# Altium footprint library ref-packages.PCBLIB: 1543 footprints (part 37 of 103)
Each footprint in its own frame and in the unit in brackets; x right, y up, seen from the top. Pads: shape width x height; smd on the part's side, far side on the other; paste and mask are expansions set on the pad; w line width, h text height; cw(c..) or ccw(c..) is an arc to the next point about the centre after c.
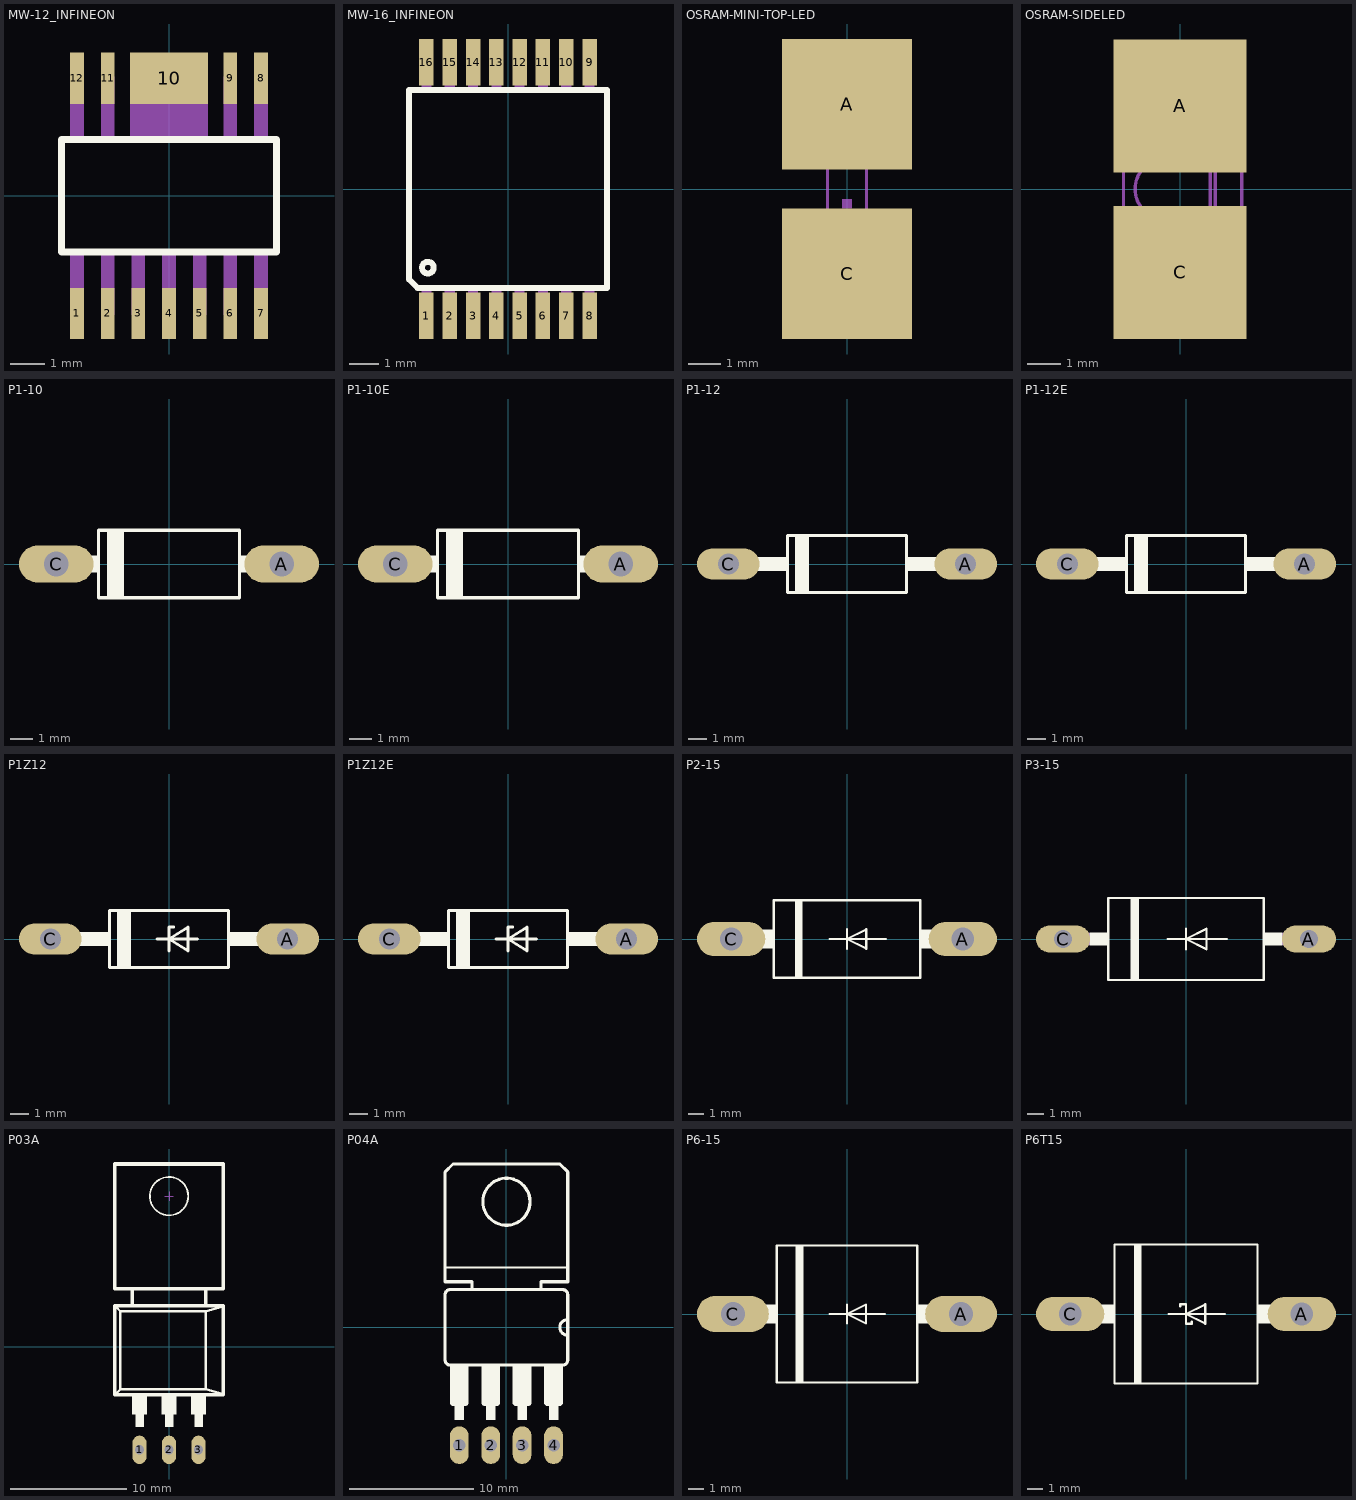
[diagram p36: the footprints below, top view; thin cyan lines are the x and y axes]

## MW-12_INFINEON [mil]
pads (12):
  rect 15.75x59.06 smd: 1(-106.3,-135.83) 2(-70.87,-135.83) 3(-35.43,-135.83) 4(0,-135.83) 5(35.43,-135.83) 6(70.87,-135.83) 7(106.3,-135.83) 8(106.3,135.83) 9(70.87,135.83) 11(-70.87,135.83) 12(-106.3,135.83)
  rect 90.55x59.06 smd: 10(0,135.83)
Top Overlay:
  lines w8: -124.02,-64.96 -124.02,64.96 124.02,64.96 124.02,-64.96 -124.02,-64.96
Mechanical 16:
  rectangle: -114.17,-137.8 -98.43,-66.93
  rectangle: -78.74,-137.8 -62.99,-66.93
  rectangle: -43.31,-137.8 -27.56,-66.93
  rectangle: -7.87,-137.8 7.87,-66.93
  rectangle: 27.56,-137.8 43.31,-66.93
  rectangle: 62.99,-137.8 78.74,-66.93
  rectangle: 98.43,-137.8 114.17,-66.93
  rectangle: 98.43,66.93 114.17,137.8
  rectangle: 62.99,66.93 78.74,137.8
  rectangle: -45.28,66.93 45.28,137.8
  rectangle: -78.74,66.93 -62.99,137.8
  rectangle: -114.17,66.93 -98.43,137.8

## MW-16_INFINEON [mm]
pads (16):
  rect 0.5x1.6 smd: 1(-2.8,-4.35) 2(-2,-4.35) 3(-1.2,-4.35) 4(-0.4,-4.35) 5(0.4,-4.35) 6(1.2,-4.35) 7(2,-4.35) 8(2.8,-4.35) 9(2.8,4.35) 10(2,4.35) 11(1.2,4.35) 12(0.4,4.35) 13(-0.4,4.35) 14(-1.2,4.35) 15(-2,4.35) 16(-2.8,4.35)
Top Overlay:
  circle w0.203: c-2.75,-2.7 r0.2
  lines w0.203: -3.4,-3.1 -3.4,3.4 3.4,3.4 3.4,-3.4 -3.1,-3.4 -3.4,-3.1
Mechanical 16:
  rectangle: -2.175,-4.5 -1.825,-3.475
  rectangle: -1.375,-4.5 -1.025,-3.475
  rectangle: -0.575,-4.5 -0.225,-3.475
  rectangle: 0.225,-4.5 0.575,-3.475
  rectangle: 1.025,-4.5 1.375,-3.475
  rectangle: 1.825,-4.5 2.175,-3.475
  rectangle: 2.625,-4.5 2.975,-3.475
  rectangle: 2.625,3.475 2.975,4.5
  rectangle: 1.825,3.475 2.175,4.5
  rectangle: 1.025,3.475 1.375,4.5
  rectangle: 0.225,3.475 0.575,4.5
  rectangle: -0.575,3.475 -0.225,4.5
  rectangle: -1.375,3.475 -1.025,4.5
  rectangle: -2.175,3.475 -1.825,4.5
  rectangle: -2.975,3.475 -2.625,4.5
  rectangle: -2.975,-4.5 -2.625,-3.475

## OSRAM-MINI-TOP-LED [mm]
pads (2):
  rect 4x4 smd: A(0,2.6) C(0,-2.6)
Top Overlay:
  text "A" at -0.635,1.905 h1.97
  text "C" at -0.635,-3.175 h1.97
Top Paste:
  rectangle: -0.5,0.6 0.5,1.4
  rectangle: -0.5,-1.4 0.5,-0.6
  rectangle: -0.45,0.65 0.45,1.35
  rectangle: -0.45,-1.35 0.45,-0.65
Mechanical 16:
  rectangle: -0.15,-0.6 0.15,-0.3
  lines w0.102: -0.45,0.95 -0.45,1.1 0.45,1.1 0.45,0.95 ; 0.45,-0.95 0.45,-1.1 -0.45,-1.1 -0.45,-0.9 -0.4,-0.9 ; -0.4,-0.9 0.6,-0.9 0.6,0.9 -0.6,0.9 -0.6,-0.7 -0.4,-0.9

## OSRAM-SIDELED [mm]
pads (2):
  rect 4x4 smd: A(0,2.5) C(0,-2.5)
Top Overlay:
  text "C" at 0.635,-3.175 h1.97
  text "A" at 0.635,2.54 h1.97
Top Paste:
  rectangle: -2.15,-2 2.15,-0.5
  rectangle: -2.15,0.5 2.15,2
Top Solder:
  rectangle: -2.25,-2.1 2.25,-0.4
  rectangle: -2.25,0.4 2.25,2.1
Mechanical 16:
  rectangle: -1.85,-2.05 -0.7,-1
  lines w0.102: 0.85,-1.2 -0.55,-0.9 cw(c-0.45,0) -0.55,0.9 0.85,1.2 ; 0.9,-2.05 0.9,2.05 ; 0.9,-2.05 -1.85,-2.05 -1.85,-0.75 -1.7,-0.75 -1.7,0.75 -1.85,0.75 -1.85,2.05 0.9,2.05 ; 0.9,-2.05 1.05,-2.05 ; 0.9,2.05 1.05,2.05 ; 1.05,-2.05 1.85,-1.85 1.85,1.85 1.05,2.05 ; 1.05,-2.05 1.05,2.05

## P1-10 [mil]
pads (2):
  oval 132x66 hole 44: A(200,0) C(-200,0)
Top Overlay:
  rectangle: -110,-60 -80,60
  rectangle: -155,-15 -125,15
  rectangle: 125,-15 155,15
  lines w6: -125,-60 125,-60 125,60 -125,60 -125,-60
Mechanical 16:
  lines w30: -200,0 -160,0 ; 160,0 200,0

## P1-10E [mil]
pads (2):
  oval 132x66 hole 44: A(200,0) C(-200,0)
Top Overlay:
  rectangle: -110,-60 -80,60
  rectangle: 125,-15 145,15
  rectangle: -145,-15 -125,15
  lines w6: -125,-60 125,-60 125,60 -125,60 -125,-60
Mechanical 16:
  lines w30: -200,0 -150,0 ; 150,0 200,0

## P1-12 [mil]
pads (2):
  oval 132x66 hole 44: A(250,0) C(-250,0)
Top Overlay:
  rectangle: -110,-60 -80,60
  rectangle: 125,-15 205,15
  rectangle: -205,-15 -125,15
  lines w6: -125,-60 125,-60 125,60 -125,60 -125,-60
Mechanical 16:
  lines w30: -250,0 -210,0 ; 210,0 250,0

## P1-12E [mil]
pads (2):
  oval 132x66 hole 44: A(250,0) C(-250,0)
Top Overlay:
  rectangle: -110,-60 -80,60
  rectangle: 125,-15 195,15
  rectangle: -195,-15 -125,15
  lines w6: -125,-60 125,-60 125,60 -125,60 -125,-60
Mechanical 16:
  lines w30: -250,0 -200,0 ; 200,0 250,0

## P1Z12 [mil]
pads (2):
  oval 132x66 hole 44: A(250,0) C(-250,0)
Top Overlay:
  rectangle: -110,-60 -80,60
  rectangle: 125,-15 205,15
  rectangle: -205,-15 -125,15
  lines w6: -25,0 0,0 ; 0,-25 0,0 ; 10,25 0,25 0,0 ; 60,0 0,0 ; 0,0 40,-25 40,25 0,0 ; -125,-60 125,-60 125,60 -125,60 -125,-60
Mechanical 16:
  lines w30: -250,0 -210,0 ; 210,0 250,0

## P1Z12E [mil]
pads (2):
  oval 132x66 hole 44: A(250,0) C(-250,0)
Top Overlay:
  rectangle: -110,-60 -80,60
  rectangle: 125,-15 195,15
  rectangle: -195,-15 -125,15
  lines w6: -25,0 0,0 ; 0,-25 0,0 ; 10,25 0,25 0,0 ; 60,0 0,0 ; 0,0 40,-25 40,25 0,0 ; -125,-60 125,-60 125,60 -125,60 -125,-60
Mechanical 16:
  lines w30: -250,0 -200,0 ; 200,0 250,0

## P2-15 [mil]
pads (2):
  oval 177x88.5 hole 59: A(300,0) C(-300,0)
Top Overlay:
  rectangle: -135,-100 -115,100
  rectangle: 190,-25 235,25
  rectangle: -235,-25 -190,25
  lines w6: -45,0 0,0 ; 0,-25 0,0 ; 0,25 0,0 ; 100,0 0,0 ; 0,0 50,25 50,-25 0,0 ; -190,-100 -190,100 190,100 190,-100 -190,-100
Mechanical 16:
  lines w50: -300,0 -245,0 ; 245,0 300,0

## P3-15 [mil]
pads (2):
  oval 132x66 hole 44: A(300,0) C(-300,0)
Top Overlay:
  rectangle: -135,-100 -115,100
  rectangle: 190,-16 235,16
  rectangle: -235,-16 -190,16
  lines w6: -45,0 0,0 ; 0,-25 0,0 ; 0,25 0,0 ; 100,0 0,0 ; 0,0 50,25 50,-25 0,0 ; -190,-100 -190,100 190,100 190,-100 -190,-100
Mechanical 16:
  lines w32: -300,0 -240,0 ; 240,0 300,0

## P03A [mil]
pads (3):
  oval 48x96 hole 32: 1(-100,-350) 2(0,-350) 3(100,-350)
Top Overlay:
  circle w6: c0,510 r65
  rectangle: -125,-230 -75,-166
  rectangle: -114,-272 -85,-213
  rectangle: -25,-230 25,-166
  rectangle: -14,-272 15,-213
  rectangle: 75,-230 125,-166
  rectangle: 86,-272 115,-213
  lines w8: -180,-160 -165,-145 ; -180,135 -165,120 ; 180,-160 125,-145 ; 180,135 125,120 ; -165,-145 125,-145 ; -165,-145 -165,120 ; -165,120 125,120 ; 125,-145 125,120
  lines w12: -124,141 -124,192 ; 124,141 124,191 ; -184,-164 184,-164 184,139 -184,139 -184,-164 ; -184,196 -184,619 184,619 184,196 -184,196
Mechanical 16:
  lines w2: -15,510 15,510 ; 0,495 0,525

## P04A [mil]
pads (4):
  oval 60x120 hole 40: 1(-150,-375) 2(-50,-375) 3(50,-375) 4(150,-375)
Top Overlay:
  circle w10: c0,400 r75
  rectangle: -180,-240 -120,-123
  rectangle: -80,-240 -20,-123
  rectangle: 20,-240 80,-123
  rectangle: -165,-295 -135,-245
  rectangle: -65,-295 -35,-245
  rectangle: 35,-295 65,-245
  rectangle: 120,-240 180,-123
  rectangle: 135,-295 165,-245
  lines w6: -190,190 190,190
  lines w10: -110,125 -110,145 -195,145 -195,495 -170,520 170,520 195,495 195,145 110,145 110,125 ; 195,-25 195,-105 cw(c180,-105) 180,-120 -180,-120 cw(c-180,-105) -195,-105 -195,105 cw(c-180,105) -180,120 180,120 cw(c180,105) 195,105 195,25 ; 195,-25 195,25 ; 195,-25 cw(c195,0) 195,25
  lines w20: -170,-240 -130,-240 ; -70,-240 -30,-240 ; 30,-240 70,-240 ; 130,-240 170,-240

## P6-15 [mil]
pads (2):
  oval 189x94.5 hole 63: A(300,0) C(-300,0)
Top Overlay:
  rectangle: -135,-180 -115,180
  rectangle: 185,-25 235,25
  rectangle: -235,-25 -185,25
  lines w6: -45,0 0,0 ; 0,-25 0,0 ; 0,25 0,0 ; 100,0 0,0 ; 0,0 50,25 50,-25 0,0 ; -185,-180 -185,180 185,180 185,-180 -185,-180
Mechanical 16:
  lines w50: -300,0 -245,0 ; 245,0 300,0

## P6T15 [mil]
pads (2):
  oval 177x88.5 hole 59: A(300,0) C(-300,0)
Top Overlay:
  rectangle: -135,-180 -115,180
  rectangle: 185,-25 235,25
  rectangle: -235,-25 -185,25
  lines w6: -45,0 0,0 ; -15,20 -15,25 0,25 0,0 ; 15,-20 15,-25 0,-25 0,0 ; 100,0 0,0 ; 0,0 50,25 50,-25 0,0 ; -185,-180 -185,180 185,180 185,-180 -185,-180
Mechanical 16:
  lines w50: -300,0 -245,0 ; 245,0 300,0